# Altium footprint library custom-case.PcbLib: 381 footprints (part 13 of 24)
Each footprint in its own frame and in the unit in brackets; x right, y up, seen from the top. Pads: shape width x height; smd on the part's side, far side on the other; paste and mask are expansions set on the pad; w line width, h text height; cw(c..) or ccw(c..) is an arc to the next point about the centre after c.
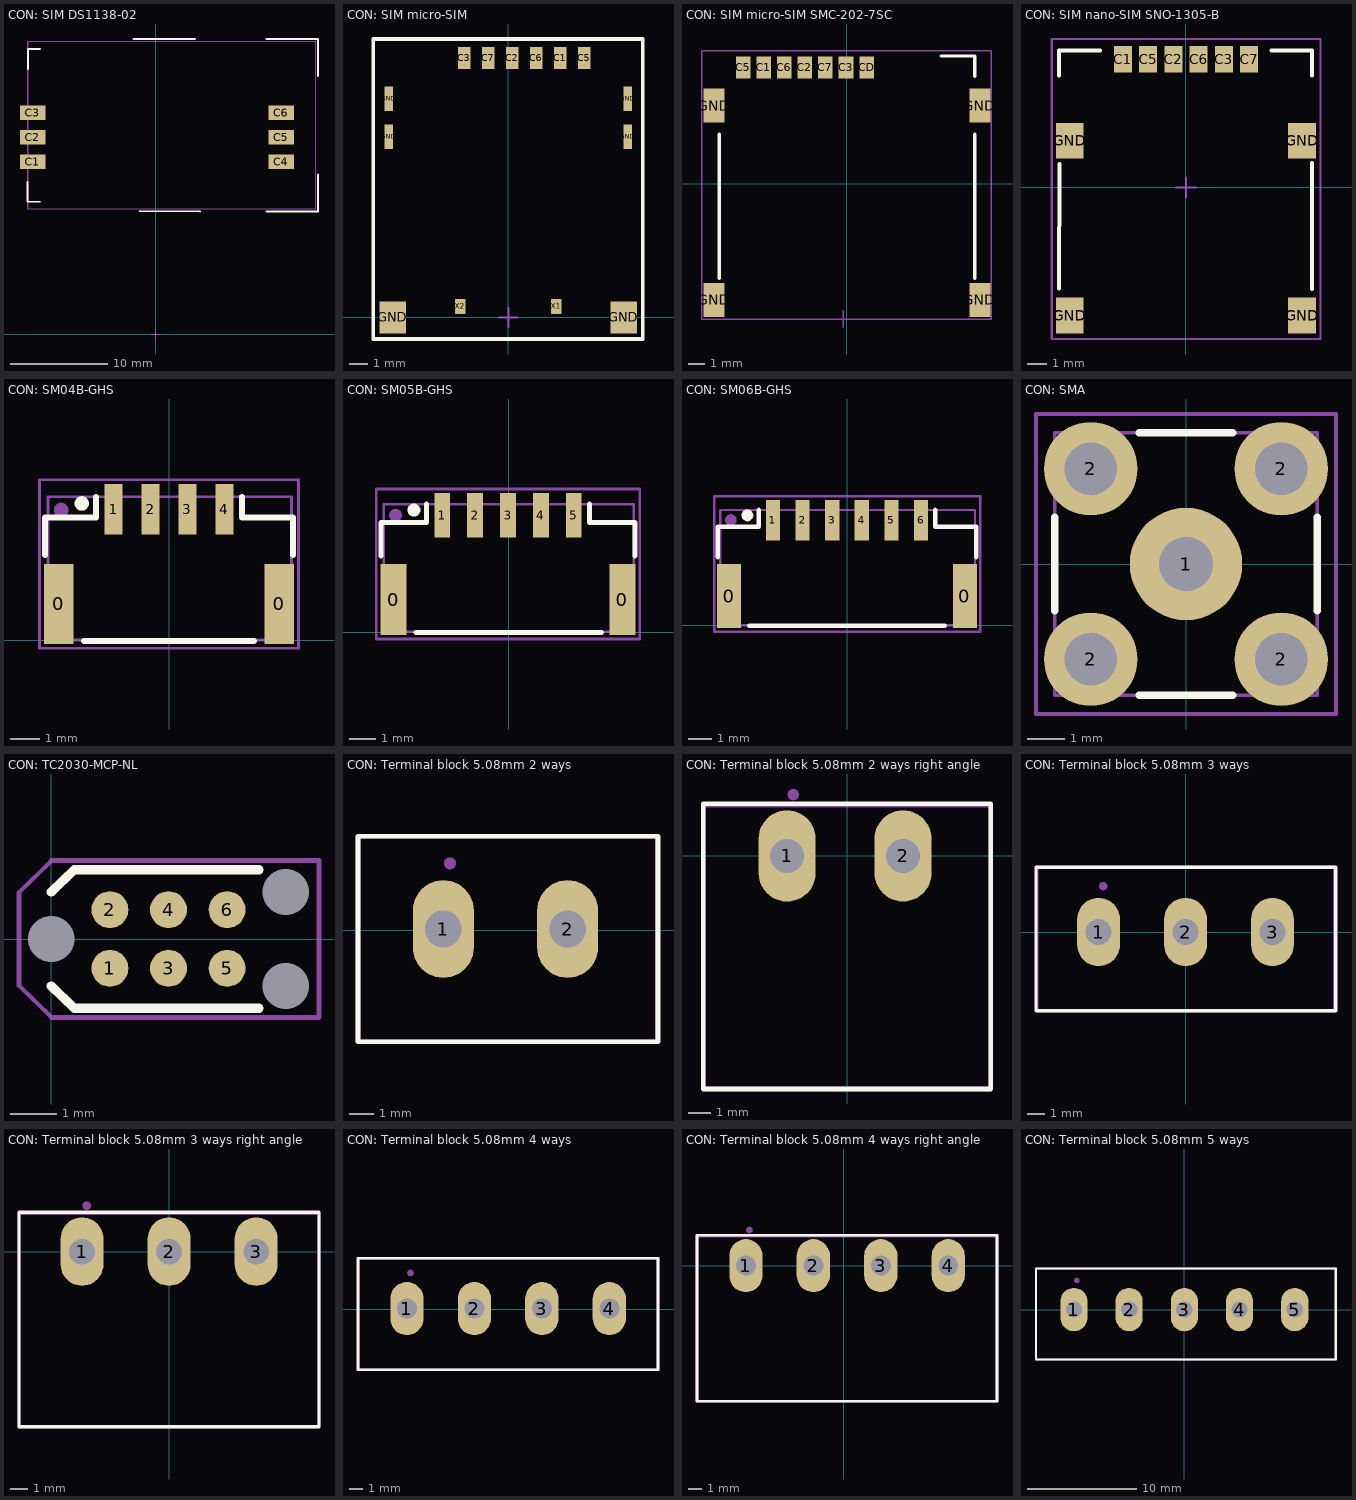
[diagram p12: the footprints below, top view; thin cyan lines are the x and y axes]

## CON: SIM DS1138-02 [mm]
pads (6):
  rect 2.65x1.5 smd: C1(-12.7,17.78) C2(-12.7,20.32) C3(-12.7,22.86) C4(12.954,17.78) C5(12.954,20.32) C6(12.954,22.86)
Top Overlay:
  lines w0.2: -13.225,15.726 -13.225,13.671 -11.955,13.671 ; -13.206,27.403 -13.206,29.458 -11.936,29.458 ; -2.276,30.48 4.064,30.48 ; -1.692,12.692 4.572,12.675 ; 11.43,12.675 16.764,12.674 16.764,16.51 ; 11.43,30.48 16.764,30.48 16.764,26.67
Top Assy:
  lines w0.1: -13.208,12.954 -13.208,30.226 16.51,30.226 16.51,12.954 -13.208,12.954
Size Area:
  lines w0.1: -0.501,0 0.501,0 ; 0,-0.5 0,0.5 ; -13.208,12.954 16.51,12.954 16.51,30.226 -13.208,30.226 -13.208,12.954
3D body "User Library-SIM holder 115B-AAA0-R.step": height 2.35, standoff -0.7, extent -13.072,12.99 16.628,30.19

## CON: SIM micro-SIM [mm]
pads (14):
  rect 0.65x1.15 smd: C1(2.755,13.73) C2(0.215,13.73) C3(-2.325,13.73) C5(4.025,13.73) C6(1.485,13.73) C7(-1.055,13.73)
  rect 0.45x1.3 smd: GND(-6.325,9.56) GND(-6.325,11.56) GND(6.325,9.56) GND(6.325,11.56)
  rect 1.4x1.7 smd: GND(-6.105,0) GND(6.105,0)
  rect 0.54x0.8 smd: X1(2.54,0.58) X2(-2.54,0.58)
Top Overlay:
  lines w0.2: -7.146,-1.143 7.112,-1.143 7.112,14.732 -7.146,14.732 -7.146,-1.143
Top Assy:
  lines w0.1: -7.134,-1.143 7.112,-1.143 7.112,14.732 -7.134,14.732 -7.134,-1.143
Size Area:
  lines w0.1: -0.501,0 0.501,0 ; 0,-0.5 0,0.5 ; -7.134,-1.143 7.112,-1.143 7.112,14.732 -7.134,14.732 -7.134,-1.143
3D body "78646-3001.stp": height 1.51, standoff 0.06, extent -6.525,-1.245 6.525,14.205

## CON: SIM micro-SIM SMC-202-7SC [mm]
pads (11):
  rect 0.9x1.35 smd: C1(-5.14,7.172) C2(-2.6,7.172) C3(-0.06,7.172) C5(-6.41,7.172) C6(-3.87,7.172) C7(-1.33,7.172) CD(1.21,7.172)
  rect 1.3x2.1 smd: GND(-8.2,-7.172) GND(-8.2,4.804) GND(8.2,-7.172) GND(8.2,4.804)
Top Overlay:
  lines w0.2: -7.874,-5.842 -7.874,3.048 ; 5.82,7.874 7.874,7.874 7.874,6.604 ; 7.874,-5.842 7.874,3.048
Top Assy:
  lines w0.1: -8.962,-8.352 -8.962,8.188 8.89,8.188 8.89,-8.352 -8.962,-8.352
Size Area:
  lines w0.1: -0.724,-8.352 0.278,-8.352 ; -0.223,-8.852 -0.223,-7.852 ; -8.962,-8.352 8.89,-8.352 8.89,8.188 -8.962,8.188 -8.962,-8.352
3D body "User Library-MICRO 1_35 SIM (CD).STEP": height 1.39, standoff -0.06, extent -8.258,-9.496 8.242,7.714

## CON: SIM nano-SIM SNO-1305-B [mm]
pads (10):
  rect 0.9x1.35 smd: C1(-3.17,6.45) C2(-0.63,6.45) C3(1.91,6.45) C5(-1.9,6.45) C6(0.64,6.45) C7(3.18,6.45)
  rect 1.4x1.8 smd: GND(-5.85,-6.45) GND(-5.85,2.35) GND(5.85,-6.45) GND(5.85,2.35)
Top Overlay:
  lines w0.2: -6.375,-5.094 -6.358,1.17 ; -6.375,5.625 -6.375,6.895 -4.321,6.895 ; 4.296,6.895 6.35,6.895 6.35,5.625 ; 6.35,-5.12 6.35,1.221
Top Assy:
  lines w0.1: -6.739,-7.63 6.774,-7.63 6.774,7.469 -6.739,7.469 -6.739,-7.63
Size Area:
  lines w0.1: -0.501,0 0.501,0 ; 0,-0.5 0,0.5 ; -6.764,-7.63 -6.764,7.469 6.774,7.469 6.774,-7.63 -6.764,-7.63
3D body "User Library-SIM8060.step": height 1.4, standoff -0.05, extent -6.208,-7.264 6.192,6.736

## CON: SM04B-GHS [mm]
pads (8):
  rect 1x2.7 smd: 0(-3.725,1.225) 0(3.725,1.225)
  rect 0.6x1.7 smd: 1(-1.875,4.425) 2(-0.625,4.425) 3(0.625,4.425) 4(1.875,4.425)
  round 0.5 on Mech13: ""(-3.65,4.4)
  round 0.5 on Top Overlay: ""(-2.95,4.625)
Top Overlay:
  lines w0.2: -4.2,2.875 -4.2,4.15 -2.475,4.15 -2.475,4.85 ; -2.875,-0.025 2.875,-0.025 ; 2.475,4.85 2.475,4.15 4.2,4.15 4.2,2.875
Top Assy:
  lines w0.1: -4.1,0 4.15,0 4.15,4.85 -4.1,4.85 -4.1,0
Size Area:
  lines w0.1: -4.375,-0.275 -4.375,5.425 4.375,5.425 4.375,-0.275 -4.375,-0.275
3D body "SM04B-GHS-TB.STEP": height 4.32, standoff -0.03, extent -4.1,0 4.15,4.85

## CON: SM05B-GHS [mm]
pads (9):
  rect 1x2.7 smd: 0(-4.375,1.25) 0(4.325,1.25)
  rect 0.6x1.7 smd: 1(-2.525,4.45) 2(-1.275,4.45) 3(-0.025,4.45) 4(1.225,4.45) 5(2.475,4.45)
  round 0.5 on Mech1: ""(-4.3,4.45)
  round 0.5 on Top Overlay: ""(-3.6,4.65)
Top Overlay:
  lines w0.2: -4.85,2.9 -4.85,4.175 -3.125,4.175 -3.125,4.875 ; -3.525,0 3.525,0 ; 3.075,4.875 3.075,4.175 4.8,4.175 4.8,2.9
Top Assy:
  lines w0.1: -4.75,0.025 -4.75,4.875 4.75,4.875 4.75,0.025 -4.75,0.025
Size Area:
  lines w0.1: -5.025,-0.25 -5.025,5.45 4.975,5.45 4.975,-0.25 -5.025,-0.25
3D body "SM05B-GHS-TB.STEP": height 4.35, standoff 0, extent -4.75,0.025 4.75,4.875

## CON: SM06B-GHS [mm]
pads (10):
  rect 1x2.7 smd: 0(-4.975,1.225) 0(4.975,1.225)
  rect 0.6x1.7 smd: 1(-3.125,4.425) 2(-1.875,4.425) 3(-0.625,4.425) 4(0.625,4.425) 5(1.875,4.425) 6(3.125,4.425)
  round 0.5 on Mech1: ""(-4.9,4.425)
  round 0.5 on Top Overlay: ""(-4.2,4.625)
Top Overlay:
  lines w0.2: -5.45,2.875 -5.45,4.15 -3.725,4.15 -3.725,4.85 ; -4.125,-0.025 4.125,-0.025 ; 3.725,4.85 3.725,4.15 5.45,4.15 5.45,2.875
Top Assy:
  lines w0.1: -5.35,0 5.4,0 5.4,4.85 -5.35,4.85 -5.35,0
Size Area:
  lines w0.1: -5.6,-0.275 5.625,-0.275 5.625,5.425 -5.6,5.425 -5.6,-0.275
3D body "SM06B-GHS-TB.STEP": height 4.33, standoff -0.02, extent -5.35,0 5.4,4.85

## CON: SMA [mm]
pads (5):
  round 3 hole 1.45: 1(0,0)
  round 2.5 hole 1.4: 2(-2.54,-2.54) 2(-2.54,2.54) 2(2.54,-2.54) 2(2.54,2.54)
Top Overlay:
  lines w0.2: -3.5,-1.25 -3.5,1.25 ; -1.25,-3.5 1.25,-3.5 ; -1.25,3.5 1.25,3.5 ; 3.5,-1.25 3.5,1.25
Top Assy:
  lines w0.1: -3.5,-3.5 -3.5,3.5 3.5,3.5 3.5,-3.5 -3.5,-3.5
Size Area:
  lines w0.1: -0.5,0 0.5,0 ; 0,-0.5 0,0.5 ; -4,-4 4,-4 4,4 -4,4 -4,-4
3D body "SMA_connector.STEP": height 9.53, standoff -3.94, extent -3.5,-3.5 3.5,3.5

## CON: TC2030-MCP-NL [mm]
pads (9):
  round 0.8 smd: 1(1.27,-0.635) 2(1.27,0.635) 3(2.54,-0.635) 4(2.54,0.635) 5(3.81,-0.635) 6(3.81,0.635)
  round 0.8 hole 1: ""(0,0) ""(5.08,-1.016) ""(5.08,1.016)
Top Overlay:
  lines w0.2: 0,-1.016 0.5,-1.5 1,-1.5 4.5,-1.5 ; 0,1.016 0.5,1.5 1,1.5 4.5,1.5
Size Area:
  lines w0.1: -0.7,-1.008 0.003,-1.7 5.8,-1.7 5.8,1.7 0.003,1.7 -0.7,1.008 -0.7,-1.008

## CON: Terminal block 5.08mm 2 ways [mm]
pads (3):
  oval 2.5x4 hole 1.5: 1(-22.76,0.059) 2(-17.68,0.059)
  round 0.5 on Mech1: ""(-22.49,2.741)
Top Overlay:
  lines w0.2: -26.25,-4.55 -26.25,3.85 -13.984,3.85 -13.984,-4.55 -26.25,-4.55
Top Assy:
  lines w0.1: -26.25,-4.55 -26.25,3.85 -13.984,3.85 -13.984,-4.55 -26.25,-4.55
Size Area:
  lines w0.2: -26.25,-4.55 -14,-4.55 -14,3.85 -26.25,3.85 -26.25,-4.55
3D body "691311500102.stp": height 12, standoff -4, extent -26.294,-4.61 -14.134,3.89

## CON: Terminal block 5.08mm 2 ways right angle [mm]
pads (3):
  oval 2.5x4 hole 1.5: 1(-2.63,0) 2(2.45,0)
  round 0.5 on Mech1: ""(-2.36,2.683)
Top Overlay:
  lines w0.2: -6.309,-10.213 6.3,-10.213 6.3,2.29 -6.309,2.29 -6.309,-10.213
Top Assy:
  lines w0.1: -6.309,-10.213 6.3,-10.213 6.3,2.302 -6.309,2.302 -6.309,-10.213
Size Area:
  lines w0.2: -6.309,-10.213 -6.309,2.228 6.3,2.228 6.3,-10.213 -6.309,-10.213
3D body "691313510002.stp": height 8.45, standoff -3.55, extent -6.115,-9.965 6.045,2.035

## CON: Terminal block 5.08mm 3 ways [mm]
pads (4):
  oval 2.5x4 hole 1.5: 1(-5.08,0) 2(0,0) 3(5.08,0)
  round 0.5 on Mech1: ""(-4.81,2.683)
Top Overlay:
  lines w0.2: -8.735,-4.609 -8.735,3.791 8.785,3.791 8.785,-4.609 -8.735,-4.609
Top Assy:
  lines w0.1: -8.707,-4.609 -8.707,3.791 8.789,3.791 8.789,-4.609 -8.707,-4.609
Size Area:
  lines w0.2: -8.7,-4.609 8.722,-4.609 8.722,3.791 -8.7,3.791 -8.7,-4.609
3D body "691311500103.stp": height 12, standoff -4, extent -8.62,-4.609 8.62,3.891

## CON: Terminal block 5.08mm 3 ways right angle [mm]
pads (4):
  oval 2.5x4 hole 1.5: 1(-5.08,0) 2(0,0) 3(5.08,0)
  round 0.5 on Mech1: ""(-4.81,2.683)
Top Overlay:
  lines w0.2: -8.759,-10.213 -8.759,2.29 8.75,2.29 8.75,-10.213 -8.759,-10.213
Top Assy:
  lines w0.1: -8.759,-10.213 -8.759,2.302 8.75,2.302 8.75,-10.213 -8.759,-10.213
Size Area:
  lines w0.2: -8.759,-10.213 8.75,-10.213 8.75,2.228 -8.759,2.228 -8.759,-10.213
3D body "691313510003.stp": height 8.45, standoff -3.55, extent -8.617,-10.1 8.623,1.9

## CON: Terminal block 5.08mm 4 ways [mm]
pads (5):
  oval 2.5x4 hole 1.5: 1(-22.76,0.059) 2(-17.68,0.059) 3(-12.6,0.059) 4(-7.52,0.059)
  round 0.5 on Mech1: ""(-22.49,2.741)
Top Overlay:
  lines w0.2: -26.446,-4.55 -26.446,3.85 -3.852,3.85 -3.852,-4.55 -26.446,-4.55
Top Assy:
  lines w0.1: -26.441,-4.55 -26.441,3.85 -3.852,3.85 -3.852,-4.55 -26.441,-4.55
Size Area:
  lines w0.2: -26.425,-4.55 -3.856,-4.55 -3.856,3.85 -26.425,3.85 -26.425,-4.55
3D body "691311500104.stp": height 12, standoff -4, extent -26.288,-4.617 -3.969,3.883

## CON: Terminal block 5.08mm 4 ways right angle [mm]
pads (5):
  oval 2.5x4 hole 1.5: 1(-7.36,0) 2(-2.28,0) 3(2.8,0) 4(7.88,0)
  round 0.5 on Mech1: ""(-7.09,2.683)
Top Overlay:
  lines w0.2: -11.039,-10.213 -11.039,2.29 11.55,2.29 11.55,-10.213 -11.039,-10.213
Top Assy:
  lines w0.1: -11.039,-10.213 -11.039,2.302 11.55,2.302 11.55,-10.213 -11.039,-10.213
Size Area:
  lines w0.2: -11.039,-10.213 11.55,-10.213 11.55,2.228 -11.039,2.228 -11.039,-10.213
3D body "691313510004.stp": height 8.45, standoff -3.55, extent -10.888,-10.031 11.432,1.969

## CON: Terminal block 5.08mm 5 ways [mm]
pads (6):
  oval 2.5x4 hole 1.5: 1(-10.16,0) 2(-5.08,0) 3(0,0) 4(5.08,0) 5(10.16,0)
  round 0.5 on Mech1: ""(-9.89,2.683)
Top Overlay:
  lines w0.2: -13.65,-4.609 -13.65,3.791 13.92,3.791 13.92,-4.609 -13.65,-4.609
Top Assy:
  lines w0.1: -13.65,-4.609 -13.65,3.791 13.92,3.791 13.92,-4.609 -13.65,-4.609
Size Area:
  lines w0.2: -13.65,-4.609 13.949,-4.609 13.949,3.791 -13.65,3.791 -13.65,-4.609
3D body "691311500105.stp": height 12, standoff -4, extent -13.65,-4.659 13.75,3.841